# Altium footprint library Mi Libreria.PcbLib: 184 footprints (part 11 of 12)
Each footprint in its own frame and in the unit in brackets; x right, y up, seen from the top. Pads: shape width x height; smd on the part's side, far side on the other; paste and mask are expansions set on the pad; w line width, h text height; cw(c..) or ccw(c..) is an arc to the next point about the centre after c.
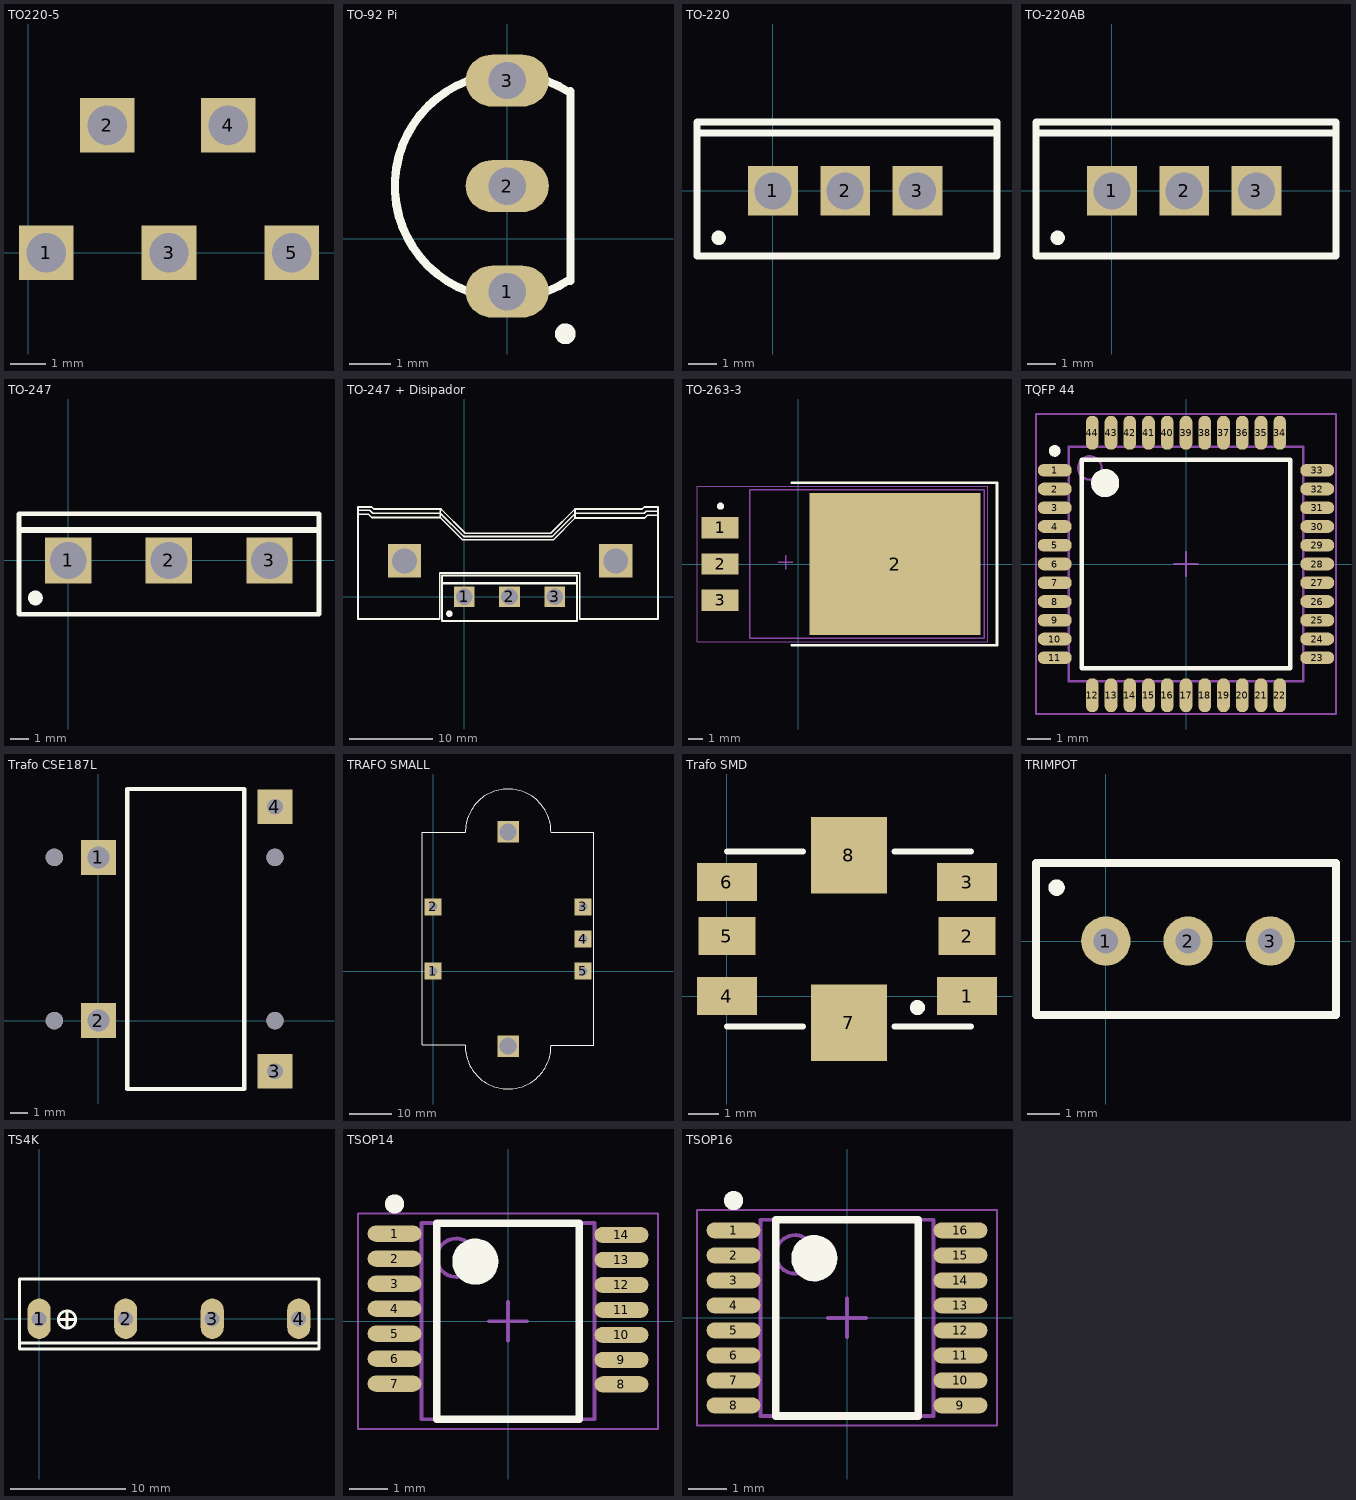
[diagram p10: the footprints below, top view; thin cyan lines are the x and y axes]

## TO220-5 [mil] "Transistor TO-220-5 c/Disipador"
pads (5):
  rect 60x60 hole 43.31: 1(20,0) 2(86.93,140) 3(155,0) 4(220,140) 5(290,0)
3D body "TO220DISIPADOR.STEP": height 905.51, standoff 157.48, extent -210,-10 538.04,403.39
3D body "TO220-5A.STEP": height 840.55, standoff -103.94, extent -45,-10 355,314.41

## TO-3 [mm] "TO-3 Transistor"
pads (4):
  oval 2x3.5 hole 1.3: 1(10.67,16.64) 2(0,16.64)
  round 7 hole 4: 3(5.335,0) 3(5.335,29.9)
Top Overlay:
  lines w0.2: -3.857,5.758 ccw(c1055.36,646.605) 2.54,-4.699 ccw(c5.334,-1.905) 8.128,-4.699 ccw(c-272.841,174.439) 14.527,5.758 ccw(c5.335,14.95) 14.527,24.142 ccw(c-134.35,-60.282) 8.128,34.544 ccw(c5.334,31.75) 2.54,34.544 ccw(c263.721,-133.26) -3.857,24.142 ccw(c5.335,14.95) -3.857,5.758
3D body "LM317_TO3.step": height 9.3, standoff -10.3, extent -7.166,-4.45 17.834,34.35

## TO-92 Pi [mm] "Transistor To-92"
pads (3):
  oval 2x1.25 hole 0.9: 1(0,-1.27) 2(0,1.27) 3(0,3.81)
Top Overlay:
  circle w0.25: c1.397,-2.286 r0.125
  lines w0.2: 1.501,-0.982 cw(c0,1.27) 1.501,3.522 ; 1.524,-1.016 1.524,3.556
Mechanical 13:
  lines w0.1: 1.512,-0.998 cw(c0.036,1.27) 1.512,3.538 ; 1.523,3.302 1.524,-0.635
Mechanical 15:
  lines w0.1: -0.5,1.27 0.5,1.27 ; 0,0.77 0,1.77
3D body "TO-92_Bent.STEP": height 8, standoff -5, extent -2.613,-1.52 1.59,4.06

## TO-220 [mm] "TO-220 Angulo"
pads (3):
  rect 1.75x1.75 hole 1.3: 1(0,0) 2(2.54,0) 3(5.08,0)
Top Overlay:
  circle w0.254: c-1.905,-1.651 r0.127
  lines w0.254: -2.667,2.032 7.874,2.032 ; -2.667,-2.286 -2.667,2.413 7.874,2.413 7.874,-2.286 -2.667,-2.286
3D body "TO-220 ANGULO.step": height 4.3, standoff -2.9, extent -2.54,-0.313 7.62,19.177

## TO-220AB [mm] "TO-220 AB MODELO PARA TRANSITORES"
pads (3):
  rect 1.75x1.75 hole 1.3: 1(0,0) 2(2.54,0) 3(5.08,0)
Top Overlay:
  circle w0.254: c-1.905,-1.651 r0.127
  lines w0.254: -2.667,2.032 7.874,2.032 ; -2.667,-2.286 7.874,-2.286 7.874,2.413 -2.667,2.413 -2.667,-2.286
3D body "TO-220AB.STEP": height 20.86, standoff -3, extent -2.794,-2.286 7.876,2.544

## TO-247 [mm] "TO-247 Tipo Transistor Potencia"
pads (3):
  rect 2.5x2.5 hole 2: 1(0,0) 2(5.45,0) 3(10.9,0)
Top Overlay:
  circle w0.4: c-1.778,-2.032 r0.2
  lines w0.254: -2.667,-2.921 13.589,-2.921 13.589,2.54 -2.667,2.54 -2.667,-2.921
  lines w0.3: -2.542,1.651 13.462,1.651
3D body "TO-247.STEP": height 27.16, standoff -14.75, extent -2.669,-3.014 13.591,2.286

## TO-247 + Disipador [mm] "TO-247 Tipo Transistor Potencia"
pads (5):
  rect 2.5x2.5 hole 2: 1(0,0) 2(5.45,0) 3(10.9,0)
  rect 4x4 hole 3: ""(-7.175,4.318) ""(18.224,4.318)
Top Overlay:
  circle w0.4: c-1.778,-2.032 r0.2
  lines w0.2: -12.763,9.906 -11.493,9.906 -11.112,9.525 -2.857,9.525 ; -12.763,10.414 -11.367,10.414 -10.986,10.033 -2.953,10.033 -2.857,10.033 -0.064,7.239 10.604,7.239 13.367,10.001 13.367,10.033 21.653,10.033 21.907,10.287 23.304,10.287 ; -2.857,9.525 -2.857,10.351 -2.794,10.414 -2.794,10.541 ; -2.857,9.525 -0.191,6.858 10.731,6.858 13.335,9.461 ; -2.794,10.541 0.127,7.62 10.414,7.62 13.335,10.541 ; -2.794,10.541 -10.858,10.541 -11.112,10.795 -12.763,10.795 -12.763,9.525 -12.763,-2.667 -2.953,-2.667 -2.953,2.857 13.906,2.857 13.906,-2.667 23.304,-2.667 23.304,9.779 ; 13.335,9.461 13.335,10.541 ; 13.335,9.461 21.717,9.461 22.034,9.779 23.304,9.779 ; 13.335,10.541 21.399,10.541 21.653,10.795 23.304,10.795 23.304,9.779
  lines w0.254: -2.667,-2.921 -2.667,2.54 13.589,2.54 13.589,-2.921 -2.667,-2.921
  lines w0.3: -2.542,1.651 13.462,1.651
3D body "HSE-B20254-035H-02.step": height 26.4, standoff -2.5, extent -12.228,-2.159 22.771,10.541
3D body "TO-247.STEP": height 25.66, standoff -16.25, extent -2.669,-3.014 13.591,2.286

## TO-263-3 [mm] "DPAK POWER TO 263"
pads (4):
  rect 2.6x1.5 smd: 1(-5.493,2.54) 2(-5.493,0) 3(-5.493,-2.54)
  rect 12x10 smd: 2(6.811,0)
Top Overlay:
  circle w0.25: c-5.461,4.064 r0.125
  lines w0.2: -0.445,-5.715 13.97,-5.715 13.97,5.715 -0.445,5.715
Mechanical 13:
  lines w0.1: -3.389,-5.207 -3.389,5.207 13.081,5.207 13.081,-5.207 -3.389,-5.207
Mechanical 15:
  lines w0.05: -7.112,-5.461 -7.112,5.461 13.335,5.461 13.335,-5.461 -7.112,-5.461
  lines w0.1: -1.389,0.127 -0.389,0.127 ; -0.889,-0.373 -0.889,0.627
3D body "TO-263-3.step": height 4.6, standoff 0, extent -5.752,-5.15 9.348,5.15

## TQFP 44 [mm] "44 TQFP"
pads (44):
  oval 1.45x0.55 smd: 1(-5.6,4) 2(-5.6,3.2) 3(-5.6,2.4) 4(-5.6,1.6) 5(-5.6,0.8) 6(-5.6,0) 7(-5.6,-0.8) 8(-5.6,-1.6) 9(-5.6,-2.4) 10(-5.6,-3.2) 11(-5.6,-4) 23(5.6,-4) 24(5.6,-3.2) 25(5.6,-2.4) 26(5.6,-1.6) 27(5.6,-0.8) 28(5.6,0) 29(5.6,0.8) 30(5.6,1.6) 31(5.6,2.4) 32(5.6,3.2) 33(5.6,4)
  oval 0.55x1.45 smd: 12(-4,-5.6) 13(-3.2,-5.6) 14(-2.4,-5.6) 15(-1.6,-5.6) 16(-0.8,-5.6) 17(0,-5.6) 18(0.8,-5.6) 19(1.6,-5.6) 20(2.4,-5.6) 21(3.2,-5.6) 22(4,-5.6) 34(4,5.6) 35(3.2,5.6) 36(2.4,5.6) 37(1.6,5.6) 38(0.8,5.6) 39(0,5.6) 40(-0.8,5.6) 41(-1.6,5.6) 42(-2.4,5.6) 43(-3.2,5.6) 44(-4,5.6)
Top Overlay:
  circle w0.6: c-3.45,3.45 r0.3
  circle w0.25: c-5.6,4.825 r0.125
  lines w0.2: -4.45,-4.45 4.45,-4.45 4.45,4.45 -4.45,4.45 -4.45,-4.45
Mechanical 13:
  circle w0.1: c-4.1,4.1 r0.5
  lines w0.1: -5,-5 5,-5 5,5 -5,5 -5,-5
Mechanical 15:
  lines w0.1: -0.5,0 0.5,0 ; 0,-0.5 0,0.5 ; -6.4,-6.4 6.4,-6.4 6.4,6.4 -6.4,6.4 -6.4,-6.4
3D body "44 pin tqfp ic package.step": height 1.1, standoff -0.01, extent -6,-6 6,6

## Trafo CSE187L [mm]
pads (8):
  rect 2x2 hole 1.254: 1(0,9.398) 2(0,0)
  rect 2x2 hole 0.9: 3(10.16,-2.921) 4(10.16,12.319)
  round 1 hole 1: ""(-2.54,0) ""(-2.54,9.398) ""(10.16,0) ""(10.16,9.398)
Top Overlay:
  lines w0.254: 1.651,-3.937 1.651,13.335 8.382,13.335 8.382,-3.937 1.651,-3.937

## TRAFO SMALL [mm] "TRANSFORMADOR PEQUEÑO"
pads (7):
  rect 4x4 hole 2: 1(0,0) 2(0,15) 3(35,15) 4(35,7.5) 5(35,0)
  rect 5x5 hole 4: ""(17.5,-17.5) ""(17.5,32.5)
Top Overlay:
  lines w0.2: 7.493,-17.145 -2.54,-17.145 -2.54,32.385 7.493,32.385 ; 7.501,32.385 cw(c17.5,32.5) 27.499,32.386 ; 7.503,-17.272 ccw(c17.5,-17.5) 27.497,-17.271 ; 27.559,-17.272 37.465,-17.272 37.465,32.385 27.559,32.385
3D body: height 4, standoff 2, extent 7.511,-22.172 27.432,-2.212
3D body: height 4, standoff 2, extent 7.511,17.198 27.432,37.158
3D body: height 32, standoff 1, extent 7.62,-13.97 27.305,29.21
3D body: height 30, standoff 1, extent 3.175,-11.43 31.75,26.67

## Trafo SMD [mm] "PA1005"
pads (8):
  rect 2x1.27 smd: 1(8.001,0) 3(8.001,3.8) 4(0,0) 6(0,3.8)
  rect 1.9x1.27 smd: 2(8.001,2) 5(0,2)
  rect 2.54x2.54 smd: 7(4.064,-0.889) 8(4.064,4.699)
Top Overlay:
  circle w0.25: c6.35,-0.381 r0.125
  lines w0.2: 0,-1.016 2.54,-1.016 ; 0,4.826 2.54,4.826 ; 5.588,-1.016 8.128,-1.016 ; 5.588,4.826 8.128,4.826
3D body "PA1005_XXXNL.step": height 5.08, standoff 0, extent 0.064,-0.889 8.064,4.699

## TRIMPOT [mil] "TRIMPOT G TROUGH HOLE"
pads (3):
  round 60 hole 30: 1(0,0) 2(100,0) 3(200,0)
Top Overlay:
  circle w10: c-60,65 r5
  lines w10: -85,-90 -85,95 280,95 280,-90 -75,-90 -85,-90
3D body "TRIMPOT.STEP": height 510.15, standoff -178.82, extent -81.1,-93.98 281.1,95

## TS4K [mm] "TS4K 800V Standard Bridge Rectifier"
pads (4):
  oval 2x3.5 hole 1.3: 1(0,0) 2(7.5,0) 3(15,0) 4(22.5,0)
Top Overlay:
  circle w0.25: c2.413,-0.064 r0.75
  lines w0.254: -1.714,-2.095 24.193,-2.096 ; 1.778,-0.064 3.163,-0.064 ; 2.413,-0.814 2.413,0.687 ; -1.714,-2.603 -1.714,3.429 24.257,3.429 24.257,-2.603 -1.714,-2.603
3D body "TS4K80.STEP": height 19.25, standoff -14.05, extent -1.26,-1.587 23.74,3.012

## TSOP14 [mm] "TSOP, 14-Leads, Pitch 0.65mm, IPC Medium Density"
height 1.1
pads (14):
  oval 1.4x0.42 smd: 1(-2.95,2.275) 2(-2.95,1.625) 3(-2.95,0.975) 4(-2.95,0.325) 5(-2.95,-0.325) 6(-2.95,-0.975) 7(-2.95,-1.625) 8(2.95,-1.64) 9(2.95,-1.005) 10(2.95,-0.355) 11(2.95,0.295) 12(2.95,0.945) 13(2.95,1.595) 14(2.95,2.245)
Top Overlay:
  circle w0.6: c-0.85,1.55 r0.3
  circle w0.25: c-2.95,3.05 r0.125
  lines w0.2: -1.85,-2.55 1.85,-2.55 1.85,2.55 -1.85,2.55 -1.85,-2.55
Mechanical 13:
  circle w0.1: c-1.35,1.65 r0.5
  lines w0.1: -2.25,-2.55 2.25,-2.55 2.25,2.55 -2.25,2.55 -2.25,-2.55
Mechanical 15:
  lines w0.05: -3.9,-2.8 3.9,-2.8 3.9,2.8 -3.9,2.8 -3.9,-2.8
  lines w0.1: -0.5,0 0.5,0 ; 0,-0.5 0,0.5
3D body "SSOP14-P065.STEP": height 1.73, standoff -0.08, extent -2.867,-2.164 3.133,2.836

## TSOP16 [mm] "TSOP, 16-Leads, Body 5.00x4.40mm, Pitch 0.65mm, IPC Medium Density"
height 1.1
pads (16):
  oval 1.4x0.42 smd: 1(-2.95,2.275) 2(-2.95,1.625) 3(-2.95,0.975) 4(-2.95,0.325) 5(-2.95,-0.325) 6(-2.95,-0.975) 7(-2.95,-1.625) 8(-2.95,-2.275) 9(2.95,-2.275) 10(2.95,-1.625) 11(2.95,-0.975) 12(2.95,-0.325) 13(2.95,0.325) 14(2.95,0.975) 15(2.95,1.625) 16(2.95,2.275)
Top Overlay:
  circle w0.25: c-2.95,3.05 r0.125
  circle w0.6: c-0.85,1.55 r0.3
  lines w0.2: -1.85,-2.55 -1.85,2.55 1.85,2.55 1.85,-2.55 -1.85,-2.55
Mechanical 13:
  circle w0.1: c-1.35,1.65 r0.5
  lines w0.1: -2.25,-2.55 -2.25,2.55 2.25,2.55 2.25,-2.55 -2.25,-2.55
Mechanical 15:
  lines w0.05: -3.9,-2.8 -3.9,2.8 3.9,2.8 3.9,-2.8 -3.9,-2.8
  lines w0.1: -0.5,0 0.5,0 ; 0,-0.5 0,0.5
3D body "TSOP16 .step": height 1.1, standoff 0, extent -3.2,-2.55 3.2,2.55